# Altium footprint library 13-IC Packages-1bga.PcbLib: 97 footprints (part 1 of 14)
Each footprint in its own frame and in the unit in brackets; x right, y up, seen from the top. Pads: shape width x height; smd on the part's side, far side on the other; paste and mask are expansions set on the pad; w line width, h text height; cw(c..) or ccw(c..) is an arc to the next point about the centre after c.
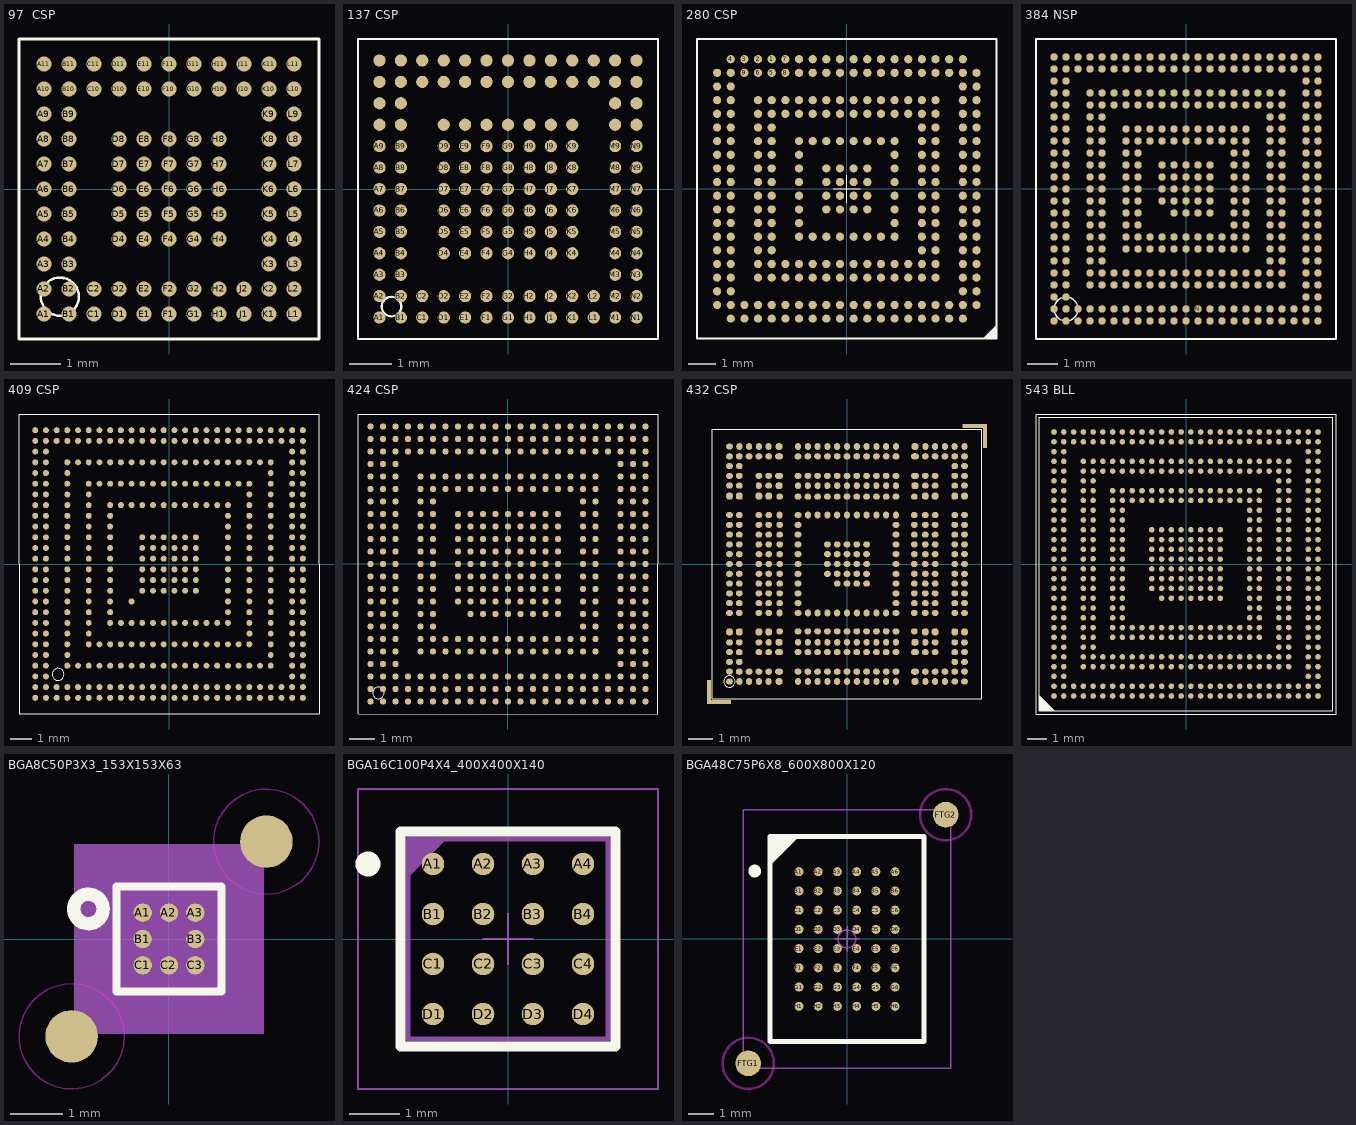
[diagram p0: the footprints below, top view; thin cyan lines are the x and y axes]

## 97  CSP [mm] "PM6653 // PM6658"
height 0.75
pads (97):
  round 0.3 smd: A1(-2.5,-2.5) A2(-2.5,-2) A3(-2.5,-1.5) A4(-2.5,-1) A5(-2.5,-0.5) A6(-2.5,0) A7(-2.5,0.5) A8(-2.5,1) A9(-2.5,1.5) A10(-2.5,2) A11(-2.5,2.5) B1(-2,-2.5) B2(-2,-2) B3(-2,-1.5) B4(-2,-1) B5(-2,-0.5) B6(-2,0) B7(-2,0.5) B8(-2,1) B9(-2,1.5) B10(-2,2) B11(-2,2.5) C1(-1.5,-2.5) C2(-1.5,-2) C10(-1.5,2) C11(-1.5,2.5) D1(-1,-2.5) D2(-1,-2) D4(-1,-1) D5(-1,-0.5) D6(-1,0) D7(-1,0.5) D8(-1,1) D10(-1,2) D11(-1,2.5) E1(-0.5,-2.5) E2(-0.5,-2) E4(-0.5,-1) E5(-0.5,-0.5) E6(-0.5,0) E7(-0.5,0.5) E8(-0.5,1) E10(-0.5,2) E11(-0.5,2.5) F1(0,-2.5) F2(0,-2) F4(0,-1) F5(0,-0.5) F6(0,0) F7(0,0.5) F8(0,1) F10(0,2) F11(0,2.5) G1(0.5,-2.5) G2(0.5,-2) G4(0.5,-1) G5(0.5,-0.5) G6(0.5,0) G7(0.5,0.5) G8(0.5,1) G10(0.5,2) G11(0.5,2.5) H1(1,-2.5) H2(1,-2) H4(1,-1) H5(1,-0.5) H6(1,0) H7(1,0.5) H8(1,1) H10(1,2) H11(1,2.5) J1(1.5,-2.5) J2(1.5,-2) J10(1.5,2) J11(1.5,2.5) K1(2,-2.5) K2(2,-2) K3(2,-1.5) K4(2,-1) K5(2,-0.5) K6(2,0) K7(2,0.5) K8(2,1) K9(2,1.5) K10(2,2) K11(2,2.5) L1(2.5,-2.5) L2(2.5,-2) L3(2.5,-1.5) L4(2.5,-1) L5(2.5,-0.5) L6(2.5,0) L7(2.5,0.5) L8(2.5,1) L9(2.5,1.5) L10(2.5,2) L11(2.5,2.5)
Top Overlay:
  circle w0.051: c-2.182,-2.153 r0.381
  lines w0.051: -3,-3 -3,3 3,3 3,-3 -3,-3
3D body "97_cps.stp": height 0.87, standoff 0, extent -2.997,-2.997 3.003,3.003

## 137 CSP [mm] "PM7540"
height 0.75
pads (137):
  round 0.285 smd mask+0.051: A1(-3,-3) A2(-3,-2.5) A3(-3,-2) A4(-3,-1.5) A5(-3,-1) A6(-3,-0.5) A7(-3,0) A8(-3,0.5) A9(-3,1) A10(-3,1.5) A11(-3,2) A12(-3,2.5) A13(-3,3) B1(-2.5,-3) B2(-2.5,-2.5) B3(-2.5,-2) B4(-2.5,-1.5) B5(-2.5,-1) B6(-2.5,-0.5) B7(-2.5,0) B8(-2.5,0.5) B9(-2.5,1) B10(-2.5,1.5) B11(-2.5,2) B12(-2.5,2.5) B13(-2.5,3) C1(-2,-3) C2(-2,-2.5) C12(-2,2.5) C13(-2,3) D1(-1.5,-3) D2(-1.5,-2.5) D4(-1.5,-1.5) D5(-1.5,-1) D6(-1.5,-0.5) D7(-1.5,0) D8(-1.5,0.5) D9(-1.5,1) D10(-1.5,1.5) D12(-1.5,2.5) D13(-1.5,3) E1(-1,-3) E2(-1,-2.5) E4(-1,-1.5) E5(-1,-1) E6(-1,-0.5) E7(-1,0) E8(-1,0.5) E9(-1,1) E10(-1,1.5) E12(-1,2.5) E13(-1,3) F1(-0.5,-3) F2(-0.5,-2.5) F4(-0.5,-1.5) F5(-0.5,-1) F6(-0.5,-0.5) F7(-0.5,0) F8(-0.5,0.5) F9(-0.5,1) F10(-0.5,1.5) F12(-0.5,2.5) F13(-0.5,3) G1(0,-3) G2(0,-2.5) G4(0,-1.5) G5(0,-1) G6(0,-0.5) G7(0,0) G8(0,0.5) G9(0,1) G10(0,1.5) G12(0,2.5) G13(0,3) H1(0.5,-3) H2(0.5,-2.5) H4(0.5,-1.5) H5(0.5,-1) H6(0.5,-0.5) H7(0.5,0) H8(0.5,0.5) H9(0.5,1) H10(0.5,1.5) H12(0.5,2.5) H13(0.5,3) J1(1,-3) J2(1,-2.5) J4(1,-1.5) J5(1,-1) J6(1,-0.5) J7(1,0) J8(1,0.5) J9(1,1) J10(1,1.5) J12(1,2.5) J13(1,3) K1(1.5,-3) K2(1.5,-2.5) K4(1.5,-1.5) K5(1.5,-1) K6(1.5,-0.5) K7(1.5,0) K8(1.5,0.5) K9(1.5,1) K10(1.5,1.5) K12(1.5,2.5) K13(1.5,3) L1(2,-3) L2(2,-2.5) L12(2,2.5) L13(2,3) M1(2.5,-3) M2(2.5,-2.5) M3(2.5,-2) M4(2.5,-1.5) M5(2.5,-1) M6(2.5,-0.5) M7(2.5,0) M8(2.5,0.5) M9(2.5,1) M10(2.5,1.5) M11(2.5,2) M12(2.5,2.5) M13(2.5,3) N1(3,-3) N2(3,-2.5) N3(3,-2) N4(3,-1.5) N5(3,-1) N6(3,-0.5) N7(3,0) N9(3,0.5) N9(3,1) N10(3,1.5) N11(3,2) N12(3,2.5) N13(3,3)
Top Overlay:
  circle w0.051: c-2.718,-2.743 r0.229
  lines w0.051: -3.5,-3.5 3.5,-3.5 3.5,3.5 -3.5,3.5 -3.5,-3.5
3D body "137_csp.stp": height 0.82, standoff 0, extent -3.505,-3.505 3.495,3.495

## 280 CSP [mm]
height 0.75
pads (280):
  round 0.302 smd mask+0.051: 1(-2.75,4.75) 2(-3.25,4.75) 3(-3.75,4.75) 4(-4.25,4.75) 5(-2.75,4.25) 6(-3.25,4.25) 7(-2.25,4.75) 8(-2.25,4.25) 9(-3.75,4.25) 10(-4.25,4.25) 31(-4.75,4.25) 32(-4.25,3.75) 33(-4.75,3.75) 34(-4.25,3.25) 35(-4.75,3.25) 36(-4.25,2.75) 37(-4.75,2.75) 38(-4.25,2.25) 39(-4.75,2.25) 40(-4.25,1.75) 41(-4.75,1.75) 42(-4.25,1.25) 43(-4.75,1.25) 44(-4.75,0.75) 45(-4.25,0.75) 46(-4.25,0.25) 47(-4.75,0.25) 48(-4.25,-0.25) 49(-4.75,-0.25) 50(-4.25,-0.75) 51(-4.75,-0.75) 52(-4.25,-1.25) 53(-4.75,-1.25) 54(-4.75,-1.75) 55(-4.25,-1.75) 56(-4.25,-2.25) 57(-4.75,-2.25) 58(-4.25,-2.75) 59(-4.75,-2.75) 60(-4.25,-3.25) 61(-4.75,-3.25) 62(-4.25,-3.75) 63(-4.75,-3.75) 64(-4.25,-4.25) 65(-4.75,-4.25) 66(-4.25,-4.75) 67(-3.75,-4.25) 68(-3.25,-4.25) 69(-2.75,-4.25) 70(-3.75,-4.75) 71(-3.25,-4.75) 72(-2.75,-4.75) 73(-2.25,-4.25) 74(-2.25,-4.75) 75(-0.75,0.75) 76(-0.25,0.75) 77(0.25,0.75) 78(0.75,0.75) 79(-0.75,0.25) 80(-0.25,0.25) 81(0.25,0.25) 82(0.75,0.25) 83(0.75,-0.25) 84(0.25,-0.25) 85(-0.25,-0.25) 86(-0.75,-0.25) 87(-0.75,-0.75) 88(-0.25,-0.75) 89(0.25,-0.75) 90(0.75,-0.75) 91(-1.75,1.75) 92(-1.25,1.75) 93(-0.75,1.75) 94(-0.25,1.75) 95(0.25,1.75) 96(0.75,1.75) 97(1.25,1.75) 98(1.75,1.75) 99(1.75,1.25) 100(1.75,0.75) 101(1.75,0.25) 102(1.75,-0.25) 103(1.75,-0.75) 104(-1.75,1.25) 105(-1.75,0.75) 106(-1.75,0.25) 107(-1.75,-0.25) 108(-1.75,-0.75) 109(1.75,-1.25) 110(1.75,-1.75) 111(1.25,-1.75) 112(0.75,-1.75) 113(0.25,-1.75) 114(-0.25,-1.75) 115(-0.75,-1.75) 116(-1.25,-1.75) 117(-1.75,-1.75) 118(-1.75,-1.25) 119(3.25,3.25) 120(3.25,2.75) 121(2.75,3.25) 122(2.75,2.75) 123(2.25,3.25) 124(2.25,2.75) 125(1.75,3.25) 126(1.75,2.75) 127(1.25,3.25) 128(1.25,2.75) 129(0.75,3.25) 130(0.75,2.75) 131(0.25,2.75) 132(0.25,3.25) 133(-0.25,3.25) 134(-0.25,2.75) 135(-0.75,3.25) 136(-0.75,2.75) 137(-1.25,3.25) 138(-1.25,2.75) 139(-1.75,3.25) 140(-1.75,2.75) 141(-2.25,3.25) 142(-2.25,2.75) 143(-2.75,3.25) 144(-2.75,2.75) 145(-3.25,3.25) 146(-3.25,2.75) 147(-2.75,2.25) 148(-3.25,2.25) 149(-2.75,1.75) 150(-3.25,1.75) 151(-2.75,1.25) 152(-3.25,1.25) 153(-2.75,0.75) 154(-3.25,0.75) 155(-2.75,0.25) 156(-3.25,0.25) 157(-2.75,-0.25) 158(-3.25,-0.25) 159(-2.75,-0.75) 160(-3.25,-0.75) 161(-2.75,-1.25) 162(-3.25,-1.25) 163(-2.75,-1.75) 164(-3.25,-1.75) 165(-2.75,-2.25) 166(-3.25,-2.25) 167(-3.25,-2.75) 168(-2.75,-2.75) 169(-2.75,-3.25) 170(-3.25,-3.25) 171(4.75,4.25) 172(4.25,4.75) 173(4.25,4.25) 174(3.75,4.75) 175(3.75,4.25) 176(3.25,4.75) 177(3.25,4.25) 178(2.75,4.75) 179(2.75,4.25) 180(2.25,4.75) 181(2.25,4.25) 182(1.75,4.75) 183(1.75,4.25) 184(1.25,4.75) 185(1.25,4.25) 186(0.75,4.25) 187(0.75,4.75) 188(0.25,4.75) 189(0.25,4.25) 190(-0.25,4.75) 191(-0.25,4.25) 192(-0.75,4.75) 193(-0.75,4.25) 194(-1.25,4.75) 195(-1.25,4.25) 196(-1.75,4.75) 197(-1.75,4.25) 198(4.75,3.75) 199(4.25,3.75) 200(4.75,3.25) 201(4.25,3.25) 202(4.75,2.75) 203(4.25,2.75) 204(4.75,2.25) 205(4.25,2.25) 206(3.25,2.25) 207(2.75,2.25) 208(4.75,1.75) 209(4.25,1.75) 210(3.25,1.75) 211(2.75,1.75) 212(3.25,1.25) 213(2.75,1.25) 214(4.25,1.25) 215(4.75,1.25) 216(4.75,0.75) 217(4.25,0.75) 218(3.25,0.75) 219(2.75,0.75) 220(4.75,0.25) 221(4.25,0.25) 222(3.25,0.25) 223(2.75,0.25) 224(4.75,-0.25) 225(4.25,-0.25) 226(3.25,-0.25) 227(2.75,-0.25) 228(4.75,-0.75) 229(4.25,-0.75) 230(3.25,-0.75) 231(2.75,-0.75) 232(2.75,-1.25) 233(3.25,-1.25) 234(4.25,-1.25) 235(4.75,-1.25) 236(2.75,-1.75) 237(3.25,-1.75) 238(4.25,-1.75) 239(4.75,-1.75) 240(2.75,-2.25) 241(3.25,-2.25) 242(4.25,-2.25) 243(4.75,-2.25) 244(1.75,-2.75) 245(2.25,-2.75) 246(2.75,-2.75) 247(3.25,-2.75) 248(4.25,-2.75) 249(4.75,-2.75) 250(4.75,-3.25) 251(4.25,-3.25) 252(3.25,-3.25) 253(2.75,-3.25) 254(2.25,-3.25) 255(1.75,-3.25) 256(4.25,-3.75) 257(4.75,-3.75) 258(4.75,-4.25) 259(4.25,-4.25) 260(4.25,-4.75) 261(3.75,-4.25) 262(3.75,-4.75) 263(3.25,-4.25) 264(3.25,-4.75) 265(2.75,-4.25) 266(2.75,-4.75) 267(2.25,-4.25) 268(2.25,-4.75) 269(1.75,-4.25) 270(1.75,-4.75) 271(1.25,-2.75) 272(1.25,-3.25) 273(1.25,-4.25) 274(1.25,-4.75) 275(0.75,-2.75) 276(0.75,-3.25) 277(0.25,-2.75) 278(0.25,-3.25) 279(-0.25,-2.75) 280(-0.25,-3.25) 281(-0.75,-2.75) 282(-1.25,-2.75) 283(0.75,-4.25) 284(0.75,-4.75) 285(0.25,-4.75) 286(0.25,-4.25) 287(-0.25,-4.25) 288(-0.25,-4.75) 289(-0.75,-4.25) 290(-0.75,-4.75) 291(-0.75,-3.25) 292(-1.25,-4.25) 293(-1.25,-4.75) 294(-1.75,-4.25) 295(-1.75,-4.75) 296(-1.25,-3.25) 297(-1.75,-2.75) 298(-2.25,-2.75) 299(-1.75,-3.25) 300(-2.25,-3.25)
Top Overlay:
  lines w0.005: 5.004,-5.485 5.487,-5.002 ; 5.044,-5.487 5.5,-5.031 ; 5.088,-5.486 5.486,-5.088 ; 5.13,-5.486 5.485,-5.131 ; 5.169,-5.488 5.487,-5.169 ; 5.211,-5.486 5.486,-5.212 ; 5.251,-5.488 5.489,-5.25 ; 5.292,-5.486 5.488,-5.29 ; 5.328,-5.489 5.482,-5.334 ; 5.366,-5.488 5.484,-5.37 ; 5.396,-5.494 5.487,-5.403
  lines w0.02: -0.5,0 0.5,0 ; 0,-0.5 0,0.5
  lines w0.076: -5.486,-5.486 -5.486,5.486 5.486,5.486 5.486,-5.486 -5.486,-5.486

## 384 NSP [mm]
height 0.75
pads (384):
  round 0.25 smd: A1(-4.4,-4.4) A2(-4.4,-4) A3(-4.4,-3.6) A4(-4.4,-3.2) A5(-4.4,-2.8) A6(-4.4,-2.4) A7(-4.4,-2) A8(-4.4,-1.6) A9(-4.4,-1.2) A10(-4.4,-0.8) A11(-4.4,-0.4) A12(-4.4,0) A13(-4.4,0.4) A14(-4.4,0.8) A15(-4.4,1.2) A16(-4.4,1.6) A17(-4.4,2) A18(-4.4,2.4) A19(-4.4,2.8) A20(-4.4,3.2) A21(-4.4,3.6) A22(-4.4,4) A23(-4.4,4.4) AA1(3.6,-4.4) AA2(3.6,-4) AA23(3.6,4.4) AB1(4,-4.4) AB2(4,-4) AB3(4,-3.6) AB4(4,-3.2) AB5(4,-2.8) AB6(4,-2.4) AB7(4,-2) AB8(4,-1.6) AB9(4,-1.2) AB10(4,-0.8) AB11(4,-0.4) AB12(4,0) AB13(4,0.4) AB14(4,0.8) AB17(4,2) AB18(4,2.4) AB19(4,2.8) AB20(4,3.2) AB22(4,4) AB23(4,4.4) AC1(4.4,-4.4) AC2(4.4,-4) AC3(4.4,-3.6) AC4(4.4,-3.2) AC5(4.4,-2.8) AC6(4.4,-2.4) AC7(4.4,-2) AC8(4.4,-1.6) AC9(4.4,-1.2) AC10(4.4,-0.8) AC11(4.4,-0.4) AC12(4.4,0) AC13(4.4,0.4) AC14(4.4,0.8) AC15(4.4,1.2) AC16(4.4,1.6) AC17(4.4,2) AC18(4.4,2.4) AC19(4.4,2.8) AC20(4.4,3.2) AC21(4.4,3.6) AC23(4.4,4.4) B1(-4,-4.4) B2(-4,-4) B3(-4,-3.6) B4(-4,-3.2) B5(-4,-2.8) B6(-4,-2.4) B8(-4,-1.6) B9(-4,-1.2) B10(-4,-0.8) B13(-4,0.4) B14(-4,0.8) B15(-4,1.2) B16(-4,1.6) B17(-4,2) B19(-4,2.8) B20(-4,3.2) B21(-4,3.6) B22(-4,4) B23(-4,4.4) C1(-3.6,-4.4) C2(-3.6,-4) C22(-3.6,4) C23(-3.6,4.4) D1(-3.2,-4.4) D2(-3.2,-4) D4(-3.2,-3.2) D5(-3.2,-2.8) D6(-3.2,-2.4) D7(-3.2,-2) D8(-3.2,-1.6) D9(-3.2,-1.2) D10(-3.2,-0.8) D12(-3.2,0) D13(-3.2,0.4) D14(-3.2,0.8) D15(-3.2,1.2) D16(-3.2,1.6) D17(-3.2,2) D18(-3.2,2.4) D19(-3.2,2.8) D20(-3.2,3.2) D22(-3.2,4) D23(-3.2,4.4) E1(-2.8,-4.4) E2(-2.8,-4) E4(-2.8,-3.2) E5(-2.8,-2.8) E6(-2.8,-2.4) E7(-2.8,-2) E8(-2.8,-1.6) E9(-2.8,-1.2) E10(-2.8,-0.8) E11(-2.8,-0.4) E13(-2.8,0.4) E14(-2.8,0.8) E15(-2.8,1.2) E16(-2.8,1.6) E17(-2.8,2) E18(-2.8,2.4) E19(-2.8,2.8) E20(-2.8,3.2) E22(-2.8,4) E23(-2.8,4.4) F1(-2.4,-4.4) F2(-2.4,-4) F4(-2.4,-3.2) F5(-2.4,-2.8) F19(-2.4,2.8) F20(-2.4,3.2) F22(-2.4,4) F23(-2.4,4.4) G1(-2,-4.4) G2(-2,-4) G4(-2,-3.2) G5(-2,-2.8) G7(-2,-2) G8(-2,-1.6) G9(-2,-1.2) G10(-2,-0.8) G11(-2,-0.4) G13(-2,0.4) G14(-2,0.8) G15(-2,1.2) G16(-2,1.6) G17(-2,2) G20(-2,3.2) G22(-2,4) G23(-2,4.4) H2(-1.6,-4) H4(-1.6,-3.2) H5(-1.6,-2.8) H7(-1.6,-2) H8(-1.6,-1.6) H9(-1.6,-1.2) H10(-1.6,-0.8) H11(-1.6,-0.4) H13(-1.6,0.4) H14(-1.6,0.8) H15(-1.6,1.2) H16(-1.6,1.6) H17(-1.6,2) H19(-1.6,2.8) H20(-1.6,3.2) H22(-1.6,4) H23(-1.6,4.4) J1(-1.2,-4.4) J2(-1.2,-4) J4(-1.2,-3.2) J5(-1.2,-2.8) J7(-1.2,-2) J8(-1.2,-1.6) J16(-1.2,1.6) J17(-1.2,2) J19(-1.2,2.8) J20(-1.2,3.2) J22(-1.2,4) J23(-1.2,4.4) K1(-0.8,-4.4) K2(-0.8,-4) K4(-0.8,-3.2) K5(-0.8,-2.8) K7(-0.8,-2) K8(-0.8,-1.6) K11(-0.8,-0.4) K14(-0.8,0.8) K16(-0.8,1.6) K17(-0.8,2) K19(-0.8,2.8) K20(-0.8,3.2) K22(-0.8,4) K23(-0.8,4.4) L1(-0.4,-4.4) L2(-0.4,-4) L4(-0.4,-3.2) L5(-0.4,-2.8) L7(-0.4,-2) L8(-0.4,-1.6) L10(-0.4,-0.8) L16(-0.4,1.6) L17(-0.4,2) L19(-0.4,2.8) L20(-0.4,3.2) L22(-0.4,4) L23(-0.4,4.4) M1(0,-4.4) M2(0,-4) N(0.4,-4) N1(0.4,-4.4) N4(0.4,-3.2) N5(0.4,-2.8) N7(0.4,-2) N8(0.4,-1.6) N16(0.4,1.6) N17(0.4,2) N19(0.4,2.8) N20(0.4,3.2) N22(0.4,4) N23(0.4,4.4) P1(0.8,-4.4) P2(0.8,-4) P4(0.8,-3.2) P5(0.8,-2.8) P7(0.8,-2) P8(0.8,-1.6) P10(0.8,-0.8) P14(0.8,0.8) P16(0.8,1.6) P17(0.8,2) P19(0.8,2.8) P20(0.8,3.2) P22(0.8,4) P23(0.8,4.4) R1(1.2,-4.4) R2(1.2,-4) R4(1.2,-3.2) R5(1.2,-2.8) R7(1.2,-2) R8(1.2,-1.6) R16(1.2,1.6) R17(1.2,2) R19(1.2,2.8) R20(1.2,3.2) R23(1.2,4.4) T2(1.6,-4) T4(1.6,-3.2) T5(1.6,-2.8) T7(1.6,-2) T8(1.6,-1.6) T9(1.6,-1.2) T10(1.6,-0.8) T11(1.6,-0.4) T13(1.6,0.4) T15(1.6,1.2) T16(1.6,1.6) T17(1.6,2) T19(1.6,2.8) T20(1.6,3.2) T22(1.6,4) T23(1.6,4.4) U1(2,-4.4) U2(2,-4) U4(2,-3.2) U5(2,-2.8) U7(2,-2) U8(2,-1.6) U9(2,-1.2) U10(2,-0.8) U11(2,-0.4) U13(2,0.4) U14(2,0.8) U15(2,1.2) U16(2,1.6) U17(2,2) U19(2,2.8) U23(2,4.4) V1(2.4,-4.4) V2(2.4,-4) V4(2.4,-3.2) V5(2.4,-2.8) V19(2.4,2.8) V20(2.4,3.2) V22(2.4,4) V23(2.4,4.4) W1(2.8,-4.4) W2(2.8,-4) W4(2.8,-3.2) W5(2.8,-2.8) W6(2.8,-2.4) W7(2.8,-2) W8(2.8,-1.6) W9(2.8,-1.2) W10(2.8,-0.8) W11(2.8,-0.4) W12(2.8,0) W13(2.8,0.4) W14(2.8,0.8) W15(2.8,1.2) W16(2.8,1.6) W17(2.8,2) W18(2.8,2.4) W19(2.8,2.8) W20(2.8,3.2) W22(2.8,4) W23(2.8,4.4) Y1(3.2,-4.4) Y2(3.2,-4) Y4(3.2,-3.2) Y5(3.2,-2.8) Y6(3.2,-2.4) Y7(3.2,-2) Y8(3.2,-1.6) Y9(3.2,-1.2) Y10(3.2,-0.8) Y11(3.2,-0.4) Y12(3.2,0) Y13(3.2,0.4) Y14(3.2,0.8) Y15/(3.2,1.2) Y16(3.2,1.6) Y17(3.2,2) Y18(3.2,2.4) Y19(3.2,2.8) Y20(3.2,3.2)
  round 0.25 smd mask+0: AA22(3.6,4) AB15(4,1.2) AB16(4,1.6) AB21(4,3.6) AC22(4.4,4) B7(-4,-2) B11(-4,-0.4) B12(-4,0) B18(-4,2.4) D11(-3.2,-0.4) E12(-2.8,0) G12(-2,0) G19(-2,2.8) H1(-1.6,-4.4) H12(-1.6,0) K12(-0.8,0) K13(-0.8,0.4) L11(-0.4,-0.4) L12(-0.4,0) L13(-0.4,0.4) L14(-0.4,0.8) M4(0,-3.2) M5(0,-2.8) M7(0,-2) M8(0,-1.6) M10(0,-0.8) M11(0,-0.4) M12(0,0) M13(0,0.4) M14(0,0.8) M16(0,1.6) M17(0,2) M19(0,2.8) M20(0,3.2) M22(0,4) M23(0,4.4) N10(0.4,-0.8) N11(0.4,-0.4) N12(0.4,0) N13(0.4,0.4) N14(0.4,0.8) P11(0.8,-0.4) P12(0.8,0) P13(0.8,0.4) R22(1.2,4) T1(1.6,-4.4) T12(1.6,0) T14(1.6,0.8) U12(2,0) U20(2,3.2) U22(2,4) Y22(3.2,4) Y23(3.2,4.4)
Top Overlay:
  circle w0.051: c-4,-4 r0.4
  lines w0.051: -5,-5 5,-5 5,5 -5,5 -5,-5
3D body "384_nsp.stp": height 1.01, standoff 0, extent -5.029,-4.978 4.971,5.022

## 409 CSP [mil] "MSM6280 // MSM6275 // MSM6800"
height 29.53
pads (409):
  round 11 smd: A1(-246.06,-246.06) A2(-246.06,-226.38) A3(-246.06,-206.69) A4(-246.06,-187.01) A5(-246.06,-167.32) A6(-246.06,-147.64) A7(-246.06,-127.95) A8(-246.06,-108.27) A9(-246.06,-88.58) A10(-246.06,-68.9) A11(-246.06,-49.21) A12(-246.06,-29.53) A13(-246.06,-9.84) A14(-246.06,9.84) A15(-246.06,29.53) A16(-246.06,49.21) A17(-246.06,68.9) A18(-246.06,88.58) A19(-246.06,108.27) A20(-246.06,127.95) A21(-246.06,147.64) A22(-246.06,167.32) A23(-246.06,187.01) A24(-246.06,206.7) A25(-246.06,226.38) A26(-246.06,246.07) AA1(147.64,-246.06) AA2(147.64,-226.38) AA4(147.64,-187.01) AA6(147.64,-147.63) AA7(148,-128) AA8(147.64,-108.27) AA9(147.64,-88.58) AA10(147.64,-68.9) AA11(147.64,-49.21) AA12(147.64,-29.53) AA13(147.64,-9.84) AA14(147.64,9.84) AA15(147.64,29.53) AA16(147.64,49.21) AA17(147.64,68.9) AA18(147.64,88.58) AA19(147.64,108.27) AA20(147.64,127.95) AA21(147.64,147.64) AA23(147.64,187.01) AA25(147.64,226.38) AA26(147.64,246.06) AB1(167.32,-246.06) AB2(167.32,-226.38) AB4(167.32,-187.01) AB23(167.32,187.01) AB25(167.32,226.38) AB26(167.32,246.07) AC1(187.01,-246.06) AC2(187.01,-226.38) AC4(187.01,-187) AC5(187.01,-167.32) AC6(187.01,-147.64) AC7(187.01,-127.95) AC8(187.01,-108.27) AC9(187.01,-88.58) AC10(187.01,-68.9) AC11(187.01,-49.21) AC12(187.01,-29.53) AC13(187.01,-9.84) AC14(187.01,9.84) AC15(187.01,29.53) AC16(187.01,49.21) AC17(187.01,68.9) AC18(187.01,88.58) AC19(187.01,108.27) AC20(187.01,127.95) AC21(187.01,147.64) AC22(187.01,167.32) AC23(187.01,187.01) AC25(187.01,226.38) AC26(187.01,246.07) AD1(206.69,-246.06) AD2(206.69,-226.38) AD25(206.69,226.38) AD26(206.69,246.06) AE1(226.38,-246.06) AE2(226.38,-226.37) AE3(226.38,-206.69) AE4(226.38,-187.01) AE5(226.38,-167.32) AE6(226.38,-147.64) AE7(226.38,-127.95) AE8(226.38,-108.27) AE9(226.38,-88.58) AE10(226.38,-68.9) AE11(226.38,-49.21) AE12(226.38,-29.53) AE13(226.38,-9.84) AE14(226.38,9.84) AE15(226.38,29.53) AE16(226.38,49.21) AE17(226.38,68.9) AE18(226.38,88.58) AE19(226.38,108.27) AE20(226.38,127.95) AE21(226.38,147.64) AE22(226.38,167.33) AE23(226.38,187.01) AE24(226.38,206.69) AE25(226.38,226.38) AE26(226.38,246.07) AF1(246.06,-246.06) AF2(246.06,-226.37) AF3(246.06,-206.69) AF4(246.06,-187.01) AF5(246.06,-167.32) AF6(246.06,-147.63) AF7(246.06,-127.95) AF8(246.06,-108.26) AF9(246.06,-88.58) AF10(246.06,-68.9) AF11(246.06,-49.21) AF12(246.06,-29.53) AF13(246.06,-9.84) AF14(246.06,9.84) AF15(246.06,29.53) AF16(246.06,49.22) AF17(246.06,68.9) AF18(246.06,88.58) AF19(246.06,108.27) AF20(246.06,127.95) AF21(246.06,147.64) AF22(246.06,167.32) AF23(246.06,187.01) AF24(246.06,206.7) AF25(246.06,226.38) AF26(246.06,246.07) B1(-226.38,-246.06) B2(-226.38,-226.38) B3(-226.38,-206.69) B4(-226.38,-187.01) B5(-226.38,-167.32) B6(-226.38,-147.64) B7(-226.38,-127.95) B8(-226.38,-108.27) B9(-226.38,-88.58) B10(-226.38,-68.9) B11(-226.38,-49.21) B12(-226.38,-29.53) B13(-226.38,-9.84) B14(-226.38,9.84) B15(-226.38,29.53) B16(-226.38,49.21) B17(-226.38,68.9) B18(-226.38,88.58) B19(-226.38,108.27) B20(-226.38,127.95) B21(-226.38,147.64) B22(-226.38,167.32) B23(-226.38,187.01) B24(-226.38,206.69) B25(-226.38,226.38) B26(-226.38,246.07) C1(-206.69,-246.06) C2(-206.69,-226.38) C25(-206.69,226.38) C26(-206.69,246.06) D1(-187.01,-246.06) D2(-187.01,-226.38) D4(-187.01,-187.01) D5(-187.01,-167.32) D6(-187.01,-147.64) D7(-187.01,-127.95) D8(-187.01,-108.27) D9(-187.01,-88.58) D10(-187.01,-68.9) D11(-187.01,-49.21) D12(-187.01,-29.53) D13(-187.01,-9.84) D14(-187.01,9.84) D15(-187.01,29.53) D16(-187.01,49.21) D17(-187.01,68.9) D18(-187.01,88.58) D19(-187.01,108.27) D20(-187.01,127.95) D21(-187.01,147.64) D22(-187.01,167.32) D23(-187.01,187.01) D25(-187.01,226.38) D26(-187.01,246.07) E1(-167.32,-246.06) E2(-167.32,-226.38) E4(-167.32,-187.01) E23(-167.32,187.01) E25(-167.32,226.38) E26(-167.32,246.06) F1(-147.64,-246.06) F2(-147.64,-226.38) F4(-147.64,-187.01) F6(-147.64,-147.64) F7(-147.64,-127.95) F8(-147.64,-108.27) F9(-147.64,-88.58) F10(-147.64,-68.9) F11(-147.64,-49.21) F12(-147.64,-29.53) F13(-147.64,-9.84) F14(-147.64,9.84) F15(-147.64,29.53) F16(-147.64,49.21) F17(-147.64,68.9) F18(-147.64,88.58) F19(-147.64,108.27) F20(-147.64,127.95) F21(-147.64,147.64) F23(-147.64,187.01) F25(-147.64,226.38) F26(-147.64,246.06) G1(-128,-246) G2(-127.95,-226.38) G4(-127.95,-187.01) G6(-127.95,-147.64) G21(-127.95,147.64) G23(-127.95,187.01) G25(-127.95,226.38) G26(-127.95,246.07) H1(-108.27,-246.06) H2(-108.27,-226.38) H4(-108.27,-187.01) H6(-108.27,-147.64) H8(-108.27,-108.26) H9(-108.27,-88.58) H10(-108.27,-68.9) H11(-108.27,-49.21) H12(-108.27,-29.53) H13(-108.27,-9.84) H14(-108.27,9.84) H15(-108.27,29.53) H16(-108.27,49.21) H17(-108.27,68.9) H18(-108.27,88.58) H19(-108.27,108.27) H21(-108.27,147.64) H23(-108.27,187.01) H25(-108.27,226.38) H26(-108.27,246.06) J1(-88.58,-246.06) J2(-88.58,-226.38) J4(-88.58,-187.01) J6(-88.58,-147.64) J8(-88.58,-108.27) J19(-88.58,108.27) J21(-88.58,147.64) J23(-88.58,187.01) J25(-88.58,226.38) J26(-88.58,246.06) K1(-68.9,-246.06) K2(-68.9,-226.38) K4(-68.9,-187.01) K6(-68.9,-147.64) K8(-68.9,-108.27) K10(-68.9,-68.89) K19(-68.9,108.27) K21(-68.9,147.64) K23(-68.9,187.01) K25(-68.9,226.38) K26(-68.9,246.06) L1(-49.21,-246.06) L2(-49.21,-226.38) L4(-49.21,-187.01) L6(-49.21,-147.64) L8(-49.21,-108.27) L11(-49.21,-49.21) L12(-49.21,-29.52) L13(-49.21,-9.84) L14(-49.21,9.84) L15(-49.21,29.53) L16(-49.21,49.21) L19(-49.21,108.27) L21(-49.21,147.64) L23(-49.21,187.01) L25(-49.21,226.38) L26(-49.21,246.06) M1(-29.53,-246.06) M2(-29.53,-226) M4(-29.53,-187.01) M6(-29.53,-147.64) M8(-29.53,-108.27) M11(-29.53,-49.21) M12(-29.53,-29.52) M13(-29.53,-9.84) M14(-29.53,9.84) M15(-29.53,29.53) M16(-29.53,49.21) M19(-29.53,108.27) M21(-29.53,147.64) M23(-29.53,187.01) M25(-29.53,226.38) M26(-29.53,246.06) N1(-9.84,-246.06) N2(-9.84,-226.38) N4(-9.84,-187.01) N6(-9.84,-147.64) N8(-9.84,-108.27) N11(-9.84,-49.21) N12(-9.84,-29.53) N13(-9.84,-9.84) N14(-9.84,9.84) N15(-9.84,29.53) N16(-9.84,49.21) N19(-9.84,108.27) N21(-9.84,147.64) N23(-9.84,187.01) N25(-9.84,226.38) N26(-9.84,246.06) P1(9.84,-246.06) P2(9.84,-226.38) P4(9.84,-187.01) P6(9.84,-147.64) P8(9.84,-108.27) P11(9.84,-49.21) P12(9.84,-29.53) P13(9.84,-9.84) P14(9.84,9.84) P15(9.84,29.53) P16(9.84,49.21) P19(9.84,108.27) P21(9.84,147.64) P23(9.84,187.01) P25(9.84,226.38) P26(9.84,246.07) R1(29.53,-246.06) R2(29.53,-226.38) R4(29.53,-187.01) R6(29.53,-147.64) R8(29.53,-108.27) R11(29.53,-49.21) R12(29.53,-29.53) R13(29.53,-9.84) R14(29.53,9.84) R15(29.53,29.53) R16(29.53,49.21) R19(29.53,108.27) R21(29.53,147.64) R23(29.53,187.01) R25(29.53,226.38) R26(29.53,246.07) T1(49.21,-246.06) T2(49.21,-226.38) T4(49.21,-187.01) T6(49.21,-147.64) T8(49.21,-108.27) T11(49.21,-49.21) T12(49.21,-29.53) T13(49.21,-9.84) T14(49.21,9.84) T15(49.21,29.53) T16(49.21,49.21) T19(49.21,108.27) T21(49.21,147.64) T23(49.21,187.01) T25(49.21,226.38) T26(49.21,246.07) U1(68.9,-246.06) U2(68.9,-226.38) U4(68.9,-187.01) U6(68.9,-147.64) U8(68.9,-108.27) U19(68.9,108.27) U21(68.9,147.64) U23(68.9,187.01) U25(68.9,226.38) U26(68.9,246.06) V1(88.58,-246.06) V2(88.58,-226.38) V4(88.58,-187.01) V6(88.58,-147.64) V8(88.58,-108.27) V19(88.58,108.27) V21(88.58,147.64) V23(88.58,187.01) V25(88.58,226.38) V26(88.58,246.07) W1(108.27,-246.06) W2(108.27,-226.38) W4(108.27,-187.01) W6(108.27,-147.64) W8(108.27,-108.26) W9(108.27,-88.58) W10(108.27,-68.9) W11(108.27,-49.21) W12(108.27,-29.53) W13(108.27,-9.84) W14(108.27,9.84) W15(108.27,29.53) W16(108.27,49.21) W17(108.27,68.9) W18(108.27,88.58) W19(108.27,108.27) W21(108.27,147.64) W23(108.27,187.01) W25(108.27,226.38) W26(108.27,246.07) Y1(127.95,-246.06) Y2(127.95,-226.38) Y4(127.95,-187.01) Y6(127.95,-147.64) Y21(127.95,147.64) Y23(127.95,187.01) Y25(127.95,226.38) Y26(127.95,246.06)
Top Overlay:
  circle w1: c-204,-203 r11
  lines w1: -275.89,-275.71 275.75,-275.71 275.74,275.75 -275.89,275.74 -275.89,-275.71
3D body "409_csp.stp": height 27.56, standoff 0, extent -274,-276 277.18,275.18

## 424 CSP [mil] "QSC-60X5"
height 29.53
pads (424):
  round 10 smd: A1(-216.54,-216.53) A2(-216.54,-196.85) A3(-216.54,-177.16) A4(-216.54,-157.48) A5(-216.54,-137.79) A6(-216.54,-118.11) A7(-216.54,-98.42) A8(-216.53,-78.74) A9(-216.53,-59.05) A10(-216.53,-39.37) A11(-216.53,-19.68) A13(-216.53,19.69) A15(-216.53,59.05) A16(-216.53,78.74) A17(-216.53,98.43) A18(-216.53,118.11) A19(-216.53,137.8) A20(-216.53,157.48) A21(-216.53,177.17) A22(-216.53,196.85) AA1(177.16,-216.54) AA2(177.16,-196.85) AA3(177.16,-177.17) AA4(177.16,-157.48) AA5(177.16,-137.8) AA6(177.16,-118.11) AA7(177.16,-98.43) AA8(177.16,-78.74) AA9(177.16,-59.06) AA10(177.17,-39.37) AA11(177.17,-19.69) AA12(177.17,0) AA13(177.17,19.68) AA14(177.17,39.37) AA15(177.17,59.05) AA16(177.17,78.74) AA17(177.17,98.42) AA18(177.17,118.11) AA19(177.17,137.79) AA20(177.17,157.48) AA21(177.17,177.16) AA22(177.17,196.85) AA23(177.17,216.53) AB1(196.85,-216.54) AB2(196.85,-196.85) AB3(196.85,-177.17) AB4(196.85,-157.48) AB5(196.85,-137.8) AB6(196.85,-118.11) AB7(196.85,-98.43) AB8(196.85,-78.74) AB9(196.85,-59.06) AB10(196.85,-39.37) AB11(196.85,-19.69) AB12(196.85,0) AB13(196.85,19.68) AB14(196.85,39.37) AB15(196.85,59.05) AB16(196.85,78.74) AB17(196.85,98.42) AB18(196.85,118.11) AB19(196.85,137.79) AB20(196.85,157.48) AB22(196.85,196.85) AB23(196.85,216.53) AC1(216.53,-216.54) AC2(216.53,-196.85) AC3(216.53,-177.17) AC4(216.53,-157.48) AC5(216.53,-137.8) AC6(216.53,-118.11) AC7(216.53,-98.43) AC8(216.53,-78.74) AC9(216.53,-59.06) AC10(216.53,-39.37) AC11(216.54,-19.69) AC12(216.54,0) AC13(216.54,19.68) AC14(216.54,39.37) AC15(216.54,59.05) AC18(216.54,118.11) AC20(216.54,157.48) AC21(216.54,177.16) AC22(216.54,196.85) AC23(216.54,216.53) B1(-196.85,-216.53) B2(-196.85,-196.85) B3(-196.85,-177.16) B4(-196.85,-157.48) B5(-196.85,-137.79) B6(-196.85,-118.11) B7(-196.85,-98.42) B8(-196.85,-78.74) B9(-196.85,-59.05) B10(-196.85,-39.37) B11(-196.85,-19.68) B13(-196.85,19.69) B21(-196.85,177.17) B23(-196.85,216.54) C1(-177.17,-216.53) C2(-177.17,-196.85) C3(-177.17,-177.16) C4(-177.17,-157.48) C5(-177.17,-137.79) C6(-177.17,-118.11) C7(-177.17,-98.42) C8(-177.16,-78.74) C9(-177.16,-59.05) C10(-177.16,-39.37) C11(-177.16,-19.68) C12(-177.16,0) C13(-177.16,19.69) C14(-177.16,39.37) C15(-177.16,59.05) C16(-177.16,78.74) C18(-177.16,118.11) C20(-177.16,157.48) C21(-177.16,177.17) C22(-177.16,196.85) C23(-177.16,216.54) D1(-157.48,-216.53) D2(-157.48,-196.85) D3(-157.48,-177.16) D21(-157.48,177.17) D23(-157.48,216.54) E1(-137.8,-216.53) E2(-137.8,-196.85) E3(-137.8,-177.16) E5(-137.8,-137.79) E6(-137.8,-118.11) E7(-137.79,-98.42) E8(-137.79,-78.74) E9(-137.79,-59.05) E10(-137.79,-39.37) E11(-137.79,-19.68) E13(-137.79,19.68) E15(-137.79,59.05) E16(-137.79,78.74) E17(-137.79,98.42) E18(-137.79,118.11) E21(-137.79,177.17) E23(-137.79,216.54) F1(-118.11,-216.53) F2(-118.11,-196.85) F3(-118.11,-177.16) F5(-118.11,-137.79) F6(-118.11,-118.11) F7(-118.11,-98.42) F8(-118.11,-78.74) F9(-118.11,-59.05) F10(-118.11,-39.37) F13(-118.11,19.68) F14(-118.11,39.37) F16(-118.11,78.74) F17(-118.11,98.42) F18(-118.11,118.11) F21(-118.11,177.17) F23(-118.11,216.54) G1(-98.43,-216.53) G2(-98.54,-197.6) G3(-98.43,-177.16) G5(-98.43,-137.79) G6(-98.42,-118.11) G18(-98.42,118.11) G19(-98.42,137.79) G21(-98.42,177.17) G22(-98.42,196.85) G23(-98.42,216.54) H1(-78.74,-216.53) H2(-78.74,-196.85) H3(-78.74,-177.16) H5(-78.74,-137.79) H6(-78.74,-118.11) H16(-78.74,78.74) H18(-78.74,118.11) H21(-78.74,177.17) H22(-78.74,196.85) H23(-78.74,216.54) J1(-59.06,-216.53) J2(-59.06,-196.85) J3(-59.06,-177.16) J5(-59.05,-137.79) J16(-59.05,78.74) J19(-59.05,137.79) J21(-59.05,177.17) J23(-59.05,216.54) K1(-39.37,-216.53) K2(-39.37,-196.85) K3(-39.37,-177.16) K5(-39.37,-137.79) K8(-39.37,-78.74) K16(-39.37,78.74) K18(-39.37,118.11) K21(-39.37,177.16) K22(-39.37,196.85) K23(-39.37,216.54) L1(-19.69,-216.53) L2(-19.69,-196.85) L3(-19.68,-177.16) L5(-19.68,-137.79) L8(-19.68,-78.74) L10(-19.68,-39.37) L16(-19.68,78.74) L18(-19.68,118.11) L19(-19.68,137.79) L21(-19.68,177.16) L23(-19.68,216.53) M1(0,-216.53) M2(0,-196.85) M3(0,-177.16) M5(0,-137.79) M6(0,-118.11) M8(0,-78.74) M9(0,-59.05) M16(0,78.74) M18(0,118.11) M19(0,137.79) M21(0,177.16) M22(0,196.85) M23(0,216.53) N1(19.68,-216.54) N2(19.68,-196.85) N3(19.68,-177.16) N5(19.68,-137.8) N8(19.68,-78.74) N9(19.68,-59.05) N18(19.69,118.11) N21(19.69,177.16) N22(19.69,196.85) N23(19.69,216.53) P1(39.37,-216.54) P2(39.37,-196.85) P3(39.37,-177.17) P5(39.37,-137.8) P6(39.37,-118.11) P12(39.37,0) P16(39.37,78.74) P18(39.37,118.11) P19(39.37,137.79) P21(39.37,177.16) P22(39.37,196.85) P23(39.37,216.53) R1(59.05,-216.54) R2(59.05,-196.85) R3(59.05,-177.17) R5(59.05,-137.8) R6(59.05,-118.11) R12(59.05,0) R13(59.05,19.68) R18(59.06,118.11) R19(59.06,137.79) R21(59.06,177.16) R22(59.06,196.85) R23(59.06,216.53) T1(78.74,-216.54) T2(78.74,-196.85) T3(78.74,-177.17) T5(78.74,-137.8) T6(78.74,-118.11) T12(78.74,0) T13(78.74,19.68) T19(78.74,137.79) T21(78.74,177.16) T22(78.74,196.85) T23(78.74,216.53) U1(98.42,-216.54) U2(98.42,-196.85) U3(98.42,-177.17) U5(98.42,-137.8) U6(98.42,-118.11) U18(98.43,118.11) U19(98.43,137.79) U21(98.43,177.16) U22(98.43,196.85) U23(98.43,216.53) V1(118.11,-216.54) V2(118.11,-196.85) V3(118.11,-177.17) V5(118.11,-137.8) V6(118.11,-118.11) V7(118.11,-98.43) V8(118.11,-78.74) V9(118.11,-59.06) V10(118.11,-39.37) V11(118.11,-19.69) V12(118.11,0) V13(118.11,19.68) V14(118.11,39.37) V15(118.11,59.05) V16(118.11,78.74) V17(-177.16,98.43) V17(118.11,98.42) V18(118.11,118.11) V19(118.11,137.79) V21(118.11,177.16) V22(118.11,196.85) V23(118.11,216.53) W1(137.79,-216.54) W2(137.79,-196.85) W3(137.79,-177.17) W5(137.79,-137.8) W6(137.79,-118.11) W7(137.79,-98.43) W8(137.79,-78.74) W9(137.79,-59.06) W10(137.79,-39.37) W11(137.8,-19.69) W12(137.8,0) W13(137.8,19.68) W14(137.8,39.37) W15(137.8,59.05) W16(137.8,78.74) W17(137.8,98.42) W18(137.8,118.11) W19(137.8,137.79) W21(137.8,177.16) W22(137.8,196.85) W23(137.8,216.53) Y1(157.48,-216.54) Y2(157.48,-196.85) Y3(157.48,-177.17) Y21(157.48,177.16) Y22(157.48,196.85) Y23(157.48,216.53)